# Altium footprint library 我的元件库02.PcbLib: 300 footprints (part 14 of 19)
Each footprint in its own frame and in the unit in brackets; x right, y up, seen from the top. Pads: shape width x height; smd on the part's side, far side on the other; paste and mask are expansions set on the pad; w line width, h text height; cw(c..) or ccw(c..) is an arc to the next point about the centre after c.
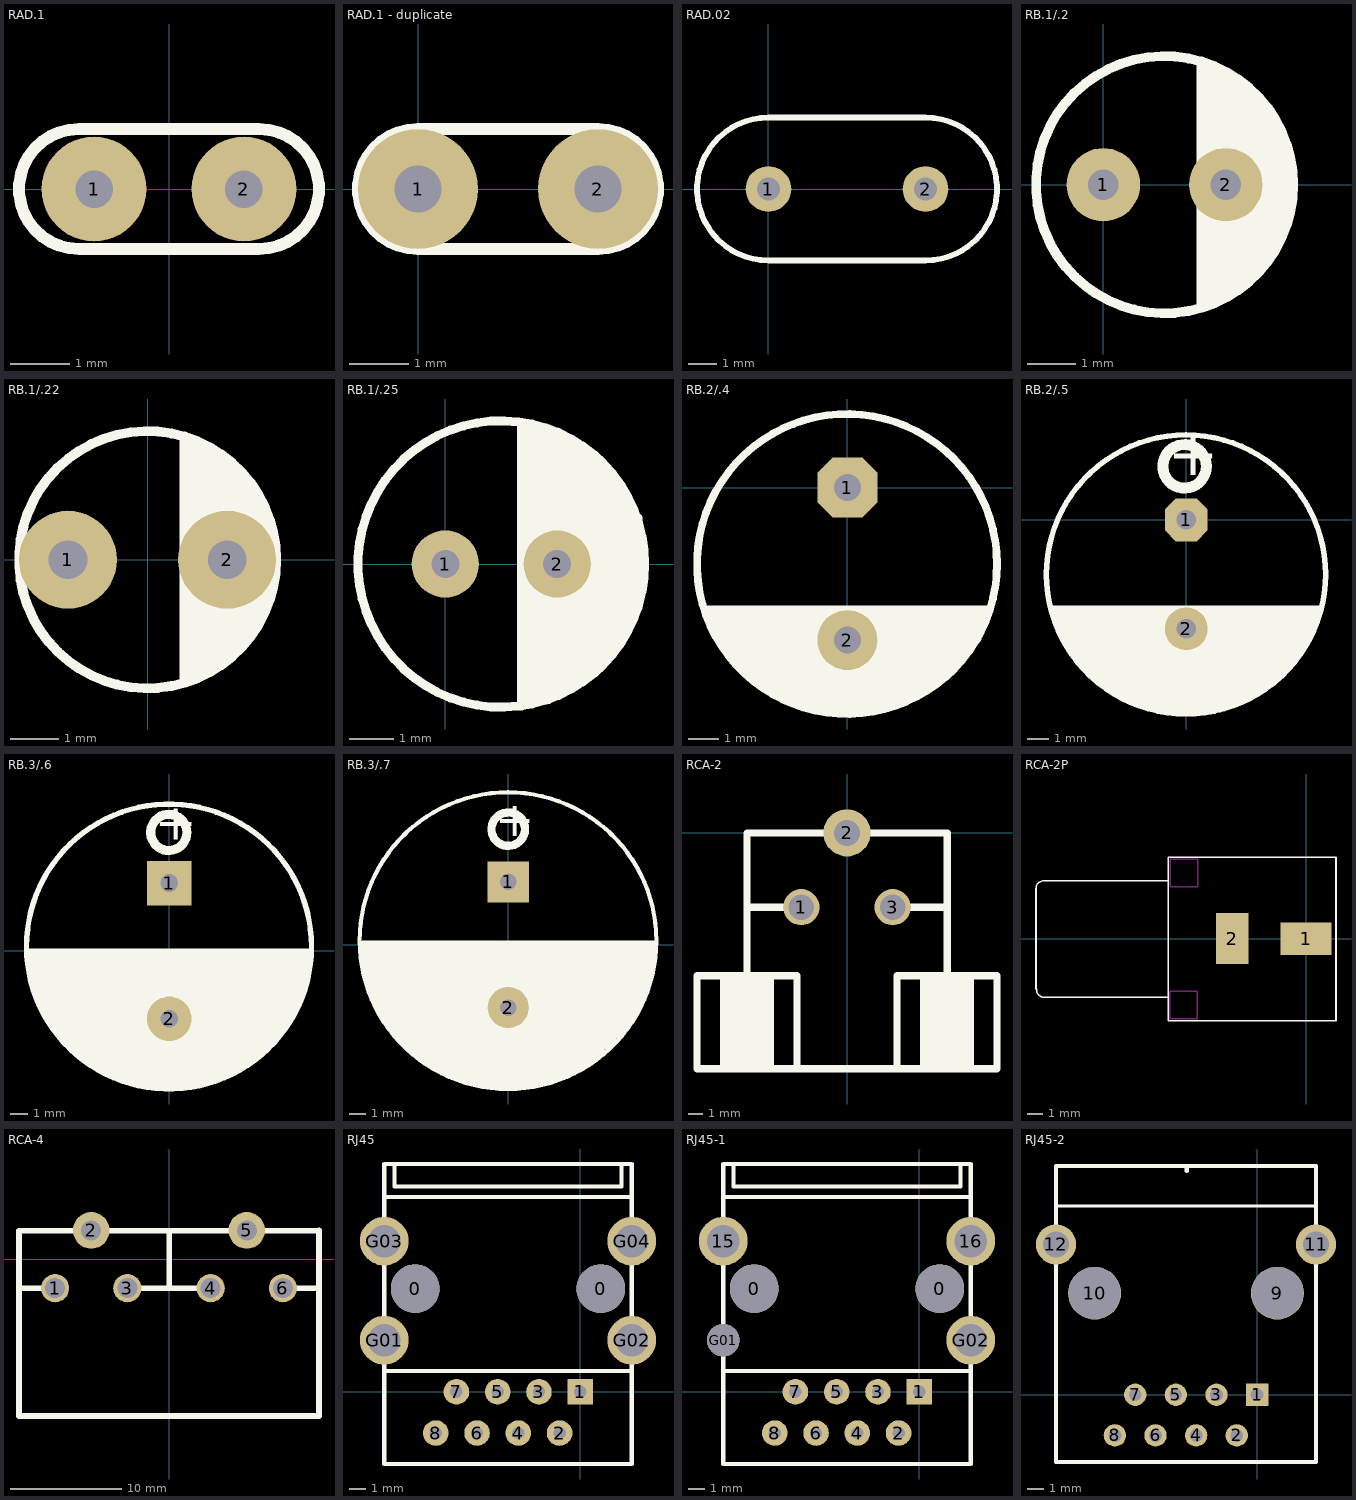
[diagram p13: the footprints below, top view; thin cyan lines are the x and y axes]

## RAD.1 [mil]
pads (2):
  round 70 hole 25: 1(-50,0) 2(50,0)
Top Overlay:
  lines w8: -60,-40 cw(c-60,0) -60,40 60,40 cw(c60,0) 60,-40 -60,-40

## RAD.1 - duplicate [mil]
pads (2):
  round 80 hole 31.5: 1(0,0) 2(120,0)
Top Overlay:
  lines w8: 0,-40 cw(c0,0) 0,40 120,40 cw(c120,0) 120,-40 0,-40

## RAD.02 [mm]
pads (2):
  round 1.6 hole 0.8: 1(0,0) 2(5.5,0)
Top Overlay:
  lines w0.2: 0,-2.5 cw(c0,0) 0,2.5 5.5,2.5 cw(c5.5,0) 5.5,-2.5 0,-2.5

## RB.1/.2 [mil]
pads (2):
  round 60 hole 25: 1(0,0) 2(100,0)
Top Overlay:
  circle w8: c50,0 r105
  lines w8: 80,-100 80,100 ; 85,-95 85,95 ; 90,-90 90,95 ; 95,-90 95,90 ; 100,-90 100,85 ; 100,-85 110,-85 ; 105,-80 105,80 ; 105,85 110,80 110,-80 ; 115,-75 115,75 ; 120,-70 120,70 ; 125,-65 125,65 ; 130,-60 130,65 ; 130,-55 135,-55 ; 135,-50 135,50 135,55 ; 140,-45 140,45 ; 145,-35 145,35 ; 150,-25 150,20
Bottom Overlay:
  lines w8: 70,0 75,0
3D body: height 453.76, standoff -128.81, extent -50.43,-99 148.43,99.85

## RB.1/.22 [mil]
pads (2):
  round 80 hole 31.5: 1(-65,0) 2(65,0)
Top Overlay:
  circle w8: c0,0 r105
  lines w8: 30,-100 30,100 ; 35,-95 35,95 ; 40,-90 40,95 ; 45,-90 45,90 ; 50,-90 50,85 ; 50,-85 60,-85 ; 55,-80 55,80 ; 55,85 60,80 60,-80 ; 65,-75 65,75 ; 70,-70 70,70 ; 75,-65 75,65 ; 80,-60 80,65 ; 80,-55 85,-55 ; 85,-50 85,50 85,55 ; 90,-45 90,45 ; 95,-35 95,35 ; 100,-25 100,20
3D body: height 440.94, standoff -740.16, extent -99.43,-100 97.43,96.85

## RB.1/.25 [mil]
pads (2):
  round 60 hole 25: 1(0,0) 2(100,0)
Top Overlay:
  circle w8: c50,0 r127.95
  lines w8: 68,-127 68,126 ; 76,-122.05 76,125 ; 76,123 83,123 84,122 84,-123 ; 92,-121 92,120 ; 100,-115 100,118 ; 108,-113 108,113 ; 116,-107 116,109 ; 124,-104 124,103 ; 132,-98 132,98 ; 140,-90 140,90 ; 148,-82 148,81 ; 156,-72 156,71 ; 164,-56 164,57 ; 172,-39 172,41
Bottom Overlay:
  lines w8: 70,0 75,0
3D body: height 512.81, standoff -118.67, extent -78,-122.02 172.03,128.02

## RB.2/.4 [mm]
pads (2):
  oct 2x2 hole 0.9: 1(0,0)
  round 2 hole 0.9: 2(0,-5.08)
Top Overlay:
  circle w0.254: c-0.013,-2.546 r5
  lines w0.254: -4.75,-4.064 4.724,-4.064 ; -4.648,-4.318 4.572,-4.318 ; -4.547,-4.572 4.547,-4.572 ; -4.47,-4.801 4.369,-4.801 ; -4.318,-5.029 4.343,-5.029 ; -4.14,-5.283 4.14,-5.283 ; -3.988,-5.512 3.962,-5.512 ; -3.759,-5.766 3.785,-5.766 ; -3.556,-5.994 3.505,-5.994 ; -3.302,-6.223 3.302,-6.223 ; -3.099,-6.452 3.023,-6.452 ; -2.794,-6.706 2.743,-6.706 ; -2.337,-6.96 2.337,-6.96 ; -1.803,-7.188 1.829,-7.188 ; -1.067,-7.417 1.067,-7.417
3D body: height 26.86, standoff -16, extent -5.03,-7.549 4.978,2.469

## RB.2/.5 [mm]
pads (2):
  oct 2x2 hole 0.9: 1(0,0)
  round 2 hole 0.9: 2(0,-5.08)
Top Overlay:
  circle w0.508: c-0.076,2.489 r1.016
  circle w0.254: c-0.013,-2.546 r6.5
  lines w0.254: -6.274,-4.115 6.172,-4.115 ; -6.248,-4.318 6.172,-4.318 ; -6.121,-4.521 6.071,-4.521 ; -6.096,-4.775 6.045,-4.775 ; -5.944,-5.004 5.893,-5.004 ; -5.817,-5.232 5.817,-5.232 ; -5.715,-5.461 5.69,-5.461 ; -5.664,-5.715 5.563,-5.715 ; -5.461,-5.944 5.461,-5.944 ; -5.385,-6.172 5.359,-6.172 ; -5.156,-6.401 5.156,-6.401 ; -5.029,-6.604 4.978,-6.604 ; -4.801,-6.858 4.826,-6.858 ; -4.623,-7.112 4.547,-7.112 ; -4.267,-7.366 4.242,-7.366 ; -4.039,-7.62 4.013,-7.62 ; -3.607,-7.874 3.658,-7.874 ; -3.251,-8.128 3.226,-8.128 ; -2.819,-8.382 2.819,-8.382 ; -2.286,-8.611 2.235,-8.611 ; -1.524,-8.839 1.549,-8.839
  text "+" at -0.864,1.372 h3.56
3D body: height 25.4, standoff -28.75, extent -6.647,-9.169 6.553,4.031

## RB.3/.6 [mm]
pads (2):
  rect 2.5x2.5 hole 1: 1(0,3.81)
  round 2.5 hole 1: 2(0,-3.81)
Top Overlay:
  circle w0.508: c-0.025,6.655 r1.016
  circle w0.3: c-0.013,0.248 r8
  lines w0.254: -8.001,0 7.925,0
  lines w0.5: -7.823,-0.787 7.798,-0.787 ; -7.798,-0.33 7.823,-0.33 ; -7.747,-1.168 7.696,-1.168 ; -7.671,-1.626 7.62,-1.626 ; -7.569,-2.032 7.493,-2.032 ; -7.417,-2.464 7.366,-2.464 ; -7.29,-2.743 7.264,-2.743 ; -7.137,-3.099 7.061,-3.099 ; -6.858,-3.454 6.883,-3.454 ; -6.604,-3.861 6.68,-3.861 ; -6.426,-4.191 6.477,-4.191 ; -6.198,-4.547 6.248,-4.547 ; -6.045,-4.801 5.994,-4.801 ; -5.664,-5.232 5.639,-5.232 ; -5.156,-5.563 5.334,-5.563 ; -4.877,-5.842 5.004,-5.842 ; -4.496,-6.096 4.674,-6.096 ; -4.039,-6.426 4.267,-6.376 ; -3.556,-6.655 3.861,-6.604 ; -3.099,-6.883 3.302,-6.883 ; -2.565,-7.137 2.591,-7.137 ; -1.753,-7.391 1.956,-7.391
  text "+" at -0.813,5.537 h3.56
3D body: height 25.01, standoff -2.7, extent -7.975,-7.686 8.025,8.255

## RB.3/.7 [mm]
pads (2):
  rect 2.5x2.5 hole 1: 1(0,3.81)
  round 2.5 hole 1: 2(0,-3.81)
Top Overlay:
  circle w0.508: c0,7.01 r1.016
  circle w0.254: c-0.013,0.248 r9
  lines w0.5: -8.8,0 8.8,0 ; -8.775,-0.991 8.7,-0.991 ; -8.698,-1.397 8.6,-1.397 ; -8.648,-1.753 8.6,-1.753 ; -8.521,-2.159 8.5,-2.159 ; -8.368,-2.515 8.357,-2.515 ; -8.216,-2.896 8.255,-2.896 ; -8.103,-3.251 8.077,-3.251 ; -7.886,-3.632 7.925,-3.632 ; -7.759,-4.039 7.671,-4.039 ; -7.505,-4.42 7.391,-4.42 ; -7.301,-4.75 7.264,-4.75 ; -6.971,-5.055 7.01,-5.055 ; -6.768,-5.41 6.731,-5.41 ; -6.438,-5.766 6.35,-5.766 ; -6.158,-6.096 6.096,-6.096 ; -5.777,-6.502 5.664,-6.502 ; -5.295,-6.858 5.283,-6.858 ; -4.787,-7.188 4.851,-7.188 ; -4.253,-7.493 4.343,-7.493 ; -3.644,-7.849 3.632,-7.849 ; -2.907,-8.103 2.946,-8.103 ; -1.917,-8.382 2.007,-8.382
  lines w1: -8.509,-0.483 8.491,-0.483
  text "+" at -0.787,5.893 h3.56
3D body: height 35.51, standoff -2.7, extent -8.983,-8.687 9.017,9.246

## RCA-2 [mm]
pads (3):
  round 2.54 hole 1.8: 1(-3.2,-5.2) 3(3.2,-5.2)
  round 3.3 hole 1.8: 2(0,0)
Top Overlay:
  rectangle: 5.283,-16.5 8.738,-10
  rectangle: -8.738,-16.5 -5.309,-10
  lines w0.254: -8.75,-16.5 -8.75,-10 ; -5.25,-16.5 -5.25,-10 ; 5.25,-16.5 5.25,-10 ; 8.75,-16.5 8.75,-10
  lines w0.508: -7,-5.2 -3.25,-5.2 ; -3.5,-16.5 -3.5,-10 -7,-10 -10.5,-10 -10.5,-16.5 -7,-16.5 ; 3.19,-5.2 7,-5.2 ; 3.5,-16.5 3.5,-10 7,-10 10.5,-10 10.5,-16.5 7.017,-16.5 7.017,0 ; 7,-16.5 -7,-16.5 ; 7,0 -7,0 -7,-16.5
3D body: height 28.01, standoff -4.39, extent -8.371,-19.634 12.029,0.166

## RCA-2P [mm]
pads (2):
  rect 3.3x2.1 all layers, no hole: 1(0,0)
  rect 2.1x3.3 all layers, no hole: 2(-4.75,0)
Top Overlay:
  lines w0.1: -17.383,-3.242 -17.383,3.225 cw(c-16.883,3.225) -16.875,3.725 -8.875,3.725 ; -17.35,-3.275 ccw(c-16.85,-3.283) -16.85,-3.783 ; -16.875,-3.775 -8.875,-3.775 ; -8.875,-5.275 1.925,-5.275 1.925,5.225 -8.875,5.225 -8.875,-5.275
Keep-Out Layer:
  lines w0.1: -8.775,-5.125 -8.775,-3.375 -7,-3.375 -7,-5.15 -8.75,-5.15 -8.775,-5.125 ; -8.75,3.325 -6.975,3.325 -6.975,5.1 -8.75,5.1 -8.75,3.325
Mechanical 1:
  lines w0.1: -5.375,-1.225 -5.375,1.175 -4.175,1.175 -4.175,-1.225 -5.375,-1.225 ; -1.175,-0.625 1.225,-0.625 1.225,0.575 -1.175,0.575 -1.175,-0.625
3D body: height 11.86, standoff -3.64, extent -17.628,-5 1.872,5

## RCA-4 [mm]
pads (6):
  round 2.54 hole 1.8: 1(-10.25,-2.6) 3(-3.75,-2.6) 4(3.75,-2.6) 6(10.25,-2.6)
  round 3.3 hole 1.8: 2(-7,2.6) 5(7,2.6)
Top Overlay:
  lines w0.508: -13.483,-2.6 -10.25,-2.6 ; -3.81,-2.6 3.81,-2.6 ; 0.017,-2.505 0.017,2.575 ; 10.25,-2.6 13.467,-2.6 ; 12.971,2.575 13.479,2.575 ; 13.5,2.575 -13.5,2.575 -13.5,-14.1 13.5,-14.1 13.5,2.6
3D body: height 27.31, standoff -5.59, extent -17.324,-17.231 17.476,2.819

## RJ45 [mil]
pads (14):
  round 118.11 hole 118.11: 0(-400,250) 0(50,250)
  rect 62x62 hole 30: 1(0,0)
  round 62 hole 30: 2(-50,-100) 3(-100,0) 4(-150,-100) 5(-200,0) 6(-250,-100) 7(-300,0) 8(-350,-100)
  round 118.11 hole 78.74: G01(-475,125) G02(125,125) G03(-475,365) G04(125,365)
Top Overlay:
  lines w10: -475,50 125,50 ; -475,472.24 125,472.24 ; -450,547.24 -450,497.24 100,497.24 100,547.24 ; -475,-175 125,-175 125,500 125,552.18 -475,552.18 -475,500 -475,-175
3D body: height 572.83, standoff -141.73, extent -523,-293.44 169.91,651.44

## RJ45-1 [mil]
pads (14):
  round 118.11 hole 118.11: 0(-400,250) 0(50,250)
  rect 62x62 hole 30: 1(0,0)
  round 62 hole 30: 2(-50,-100) 3(-100,0) 4(-150,-100) 5(-200,0) 6(-250,-100) 7(-300,0) 8(-350,-100)
  round 118.11 hole 78.74: 15(-475,365) 16(125,365) G02(125,125)
  round 78.74 hole 78.74: G01(-475,125)
Top Overlay:
  lines w10: -475,50 125,50 ; -475,472.24 125,472.24 ; -450,547.24 -450,497.24 100,497.24 100,547.24 ; -475,-175 -475,500 -475,552.18 125,552.18 125,500 125,-175 -475,-175
3D body: height 572.83, standoff -141.73, extent -523,-293.44 169.91,651.44

## RJ45-2 [mil]
pads (12):
  rect 55x55 hole 31.5: 1(0,0)
  round 55 hole 31.5: 2(-50,-100) 3(-100,0) 4(-150,-100) 5(-200,0) 6(-250,-100) 7(-300,0) 8(-350,-100)
  round 130 hole 127.95 unplated: 9(50,250) 10(-400,250)
  round 98.42 hole 62.99: 11(145,370) 12(-495,370)
Top Overlay:
  lines w8: -488.19,464.57 141.73,464.57
  lines w10: -495,-165.35 144.65,-165.35 145,-165 145,370 145,562.99 -495,562.99 -495,370 -495,-165 ; -173.23,551.18 -173.23,559.06
3D body: height 127.85, standoff -555.12, extent -490,-172.17 139.92,556.17